# Altium footprint library Tomra_Cadstar_Footprints.PcbLib: 380 footprints (part 22 of 24)
Each footprint in its own frame and in the unit in brackets; x right, y up, seen from the top. Pads: shape width x height; smd on the part's side, far side on the other; paste and mask are expansions set on the pad; w line width, h text height; cw(c..) or ccw(c..) is an arc to the next point about the centre after c.
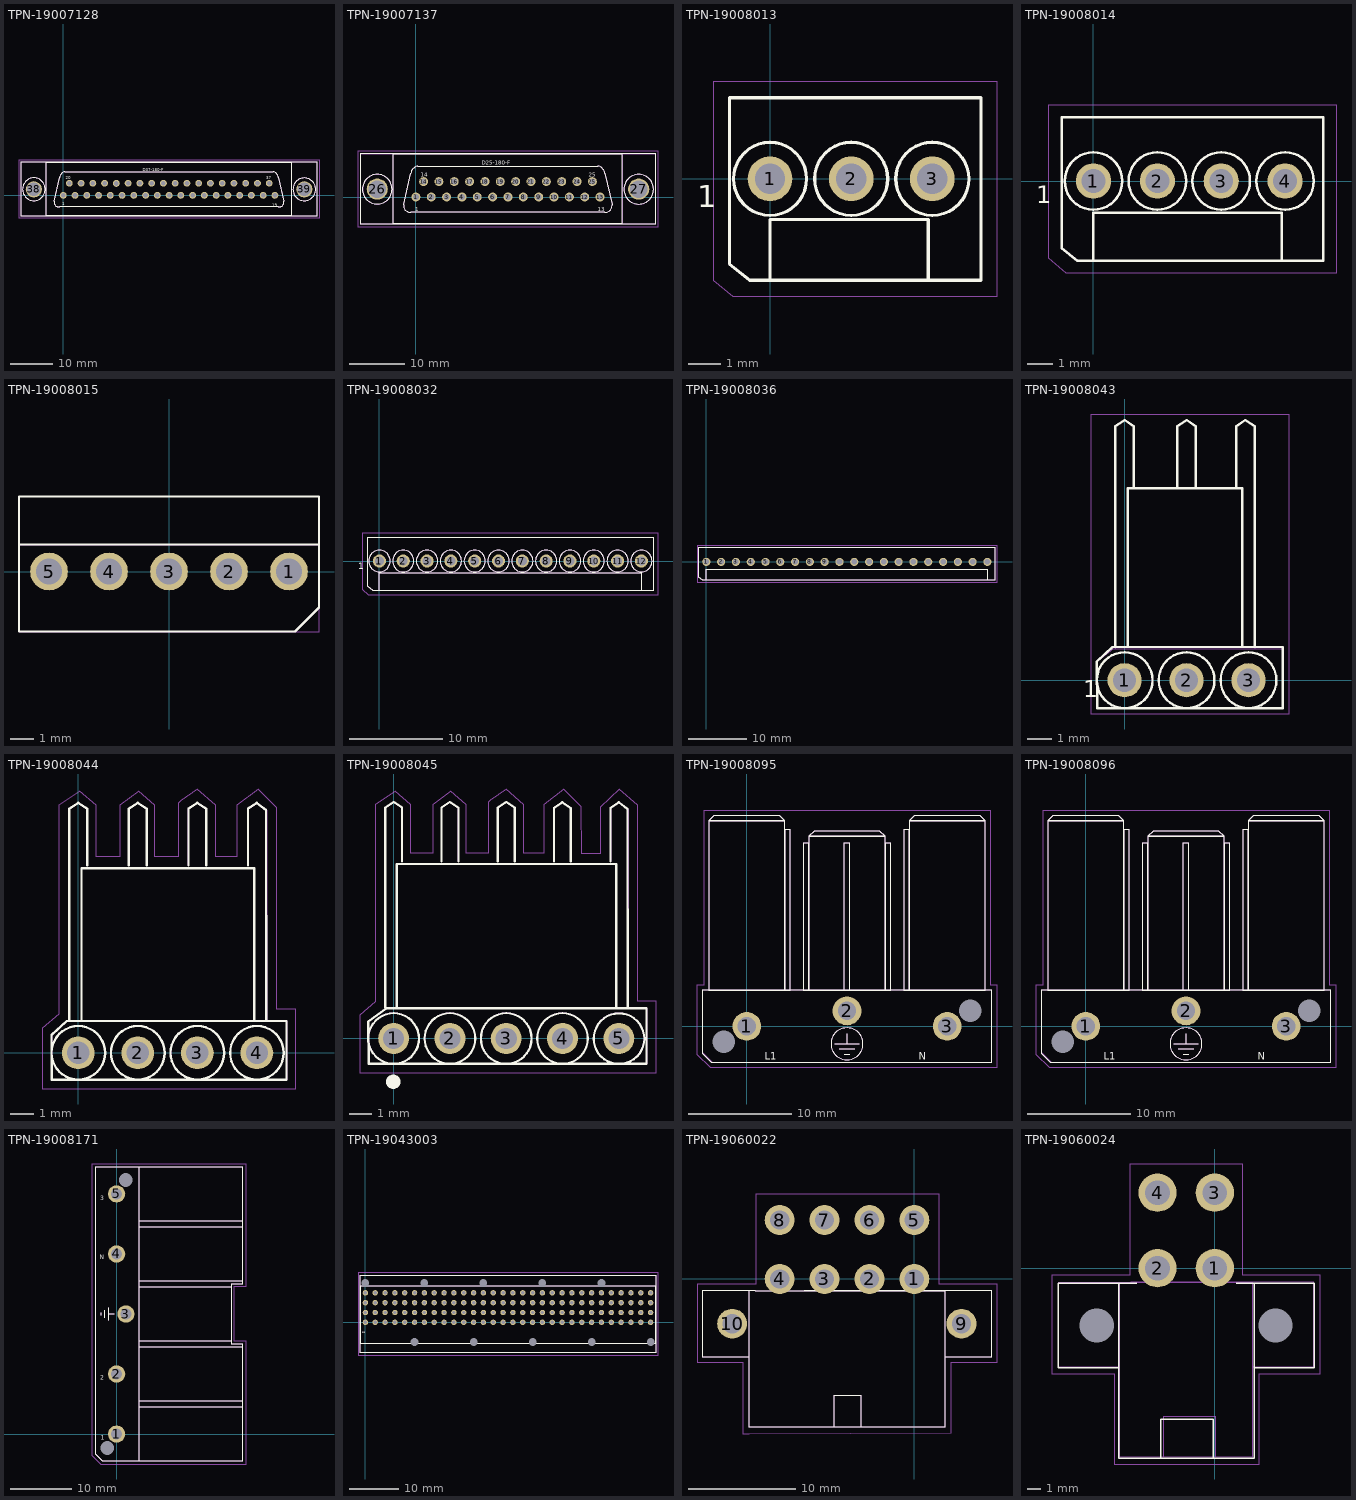
[diagram p21: the footprints below, top view; thin cyan lines are the x and y axes]

## TPN-19007128 [mm]
pads (39):
  round 1.6 / inner round 1.524 / far side round 1.6 hole 1.1 paste+0 mask+0: 1(0,0) 2(2.76,0) 3(5.52,0) 4(8.28,0) 5(11.04,0) 6(13.8,0) 7(16.56,0) 8(19.32,0) 9(22.08,0) 10(24.84,0) 11(27.6,0) 12(30.36,0) 13(33.12,0) 14(35.88,0) 15(38.64,0) 16(41.4,0) 17(44.16,0) 18(46.92,0) 19(49.68,0) 20(1.42,2.84) 21(4.18,2.84) 22(6.94,2.84) 23(9.7,2.84) 24(12.46,2.8) 25(15.22,2.84) 26(17.98,2.84) 27(20.74,2.84) 28(23.5,2.84) 29(26.26,2.84) 30(29.02,2.84) 31(31.78,2.84) 32(34.54,2.84) 33(37.3,2.84) 34(40.06,2.84) 35(42.82,2.84) 36(45.58,2.84) 37(48.34,2.84)
  round 3.8 / inner round 1.524 / far side round 3.8 hole 3.15 paste+0 mask+0: 38(-6.91,1.42) 39(56.58,1.41)
Top Silk:
  lines w0.1: -9.894,-4.861 59.527,-4.861 59.527,7.839 -9.894,7.839 -9.894,-4.861 ; -6.91,-1.247 cw(c-6.91,1.42) -6.91,4.087 cw(c-6.91,1.42) -6.91,-1.247 ; -4.052,-4.848 53.558,-4.848 53.558,7.801 -4.052,7.801 -4.052,-4.848 ; -2.147,-1.435 ccw(c-1.042,-1.6) -0.877,-2.705 50.51,-2.705 ccw(c50.675,-1.6) 51.78,-1.435 50.51,4.28 ccw(c48.923,3.962) 49.24,5.55 0.393,5.55 ccw(c0.626,4.047) -0.877,4.28 -2.147,-1.435 ; 56.58,-1.257 ccw(c56.58,1.41) 56.58,4.077 ccw(c56.58,1.41) 56.58,-1.257
  text "37" at 47.67,3.77 h0.7
  text "19" at 49.06,-2.65 h0.7
  text "20" at 0.62,3.77 h0.7
  text "1" at -0.22,-2.36 h0.7
  text "D37-180-F" at 18.66,5.7 h0.7
  text ".Designator" at 0,0 h0.7
Top Assembly:
  lines w0.05: -9.894,-4.861 59.527,-4.861 59.527,7.839 -9.894,7.839 -9.894,-4.861 ; -6.91,-1.247 cw(c-6.91,1.42) -6.91,4.087 cw(c-6.91,1.42) -6.91,-1.247 ; -4.052,-4.848 53.558,-4.848 53.558,7.801 -4.052,7.801 -4.052,-4.848 ; -2.147,-1.435 ccw(c-1.042,-1.6) -0.877,-2.705 50.51,-2.705 ccw(c50.675,-1.6) 51.78,-1.435 50.51,4.28 ccw(c48.923,3.962) 49.24,5.55 0.393,5.55 ccw(c0.626,4.047) -0.877,4.28 -2.147,-1.435 ; 56.58,-1.257 ccw(c56.58,1.41) 56.58,4.077 ccw(c56.58,1.41) 56.58,-1.257
  text "37" at 47.61,3.77 h0.7
  text "19" at 49,-2.65 h0.7
  text "20" at 0.56,3.77 h0.7
  text "1" at -0.28,-2.36 h0.7
  text "D37-180-F" at 18.66,5.7 h0.7
Top Placement:
  lines w0.01: -10.394,-5.361 60.027,-5.361 60.027,8.339 -10.394,8.339 -10.394,-5.361

## TPN-19007137 [mm]
height 17.5
pads (27):
  round 1.6 / inner round 1.524 / far side round 1.6 hole 1.1 paste+0 mask+0: 1(0,0) 2(2.76,0) 3(5.52,0) 4(8.28,0) 5(11.04,0) 6(13.8,0) 7(16.56,0) 8(19.32,0) 9(22.08,0) 10(24.84,0) 11(27.6,0) 12(30.36,0) 13(33.12,0) 14(1.38,2.78) 15(4.14,2.78) 16(6.9,2.78) 17(9.66,2.78) 18(12.42,2.78) 19(15.18,2.78) 20(17.94,2.78) 21(20.7,2.78) 22(23.46,2.78) 23(26.22,2.78) 24(28.98,2.78) 25(31.74,2.78)
  round 3.8 / inner round 1.524 / far side round 3.8 hole 3.15 paste+0 mask+0: 26(-6.958,1.42) 27(40.07,1.41)
Top Silk:
  lines w0.1: -9.942,-4.861 43.017,-4.861 43.017,7.839 -9.942,7.839 -9.942,-4.861 ; -6.958,-1.244 cw(c-6.958,1.423) -6.958,4.09 cw(c-6.958,1.423) -6.958,-1.244 ; -4.1,-4.848 37.048,-4.848 37.048,7.801 -4.1,7.801 -4.1,-4.848 ; -2.195,-1.435 ccw(c-1.09,-1.6) -0.925,-2.705 34,-2.705 ccw(c34.165,-1.6) 35.27,-1.435 34,4.28 ccw(c32.413,3.962) 32.73,5.55 0.345,5.55 ccw(c0.578,4.047) -0.925,4.28 -2.195,-1.435 ; 40.07,-1.257 ccw(c40.07,1.41) 40.07,4.077 ccw(c40.07,1.41) 40.07,-1.257
  text "1" at -0.16,-2.58 h0.7
  text "14" at 0.856,3.643 h0.7
  text "13" at 32.733,-2.58 h0.7
  text "25" at 31.082,3.643 h0.7
  text "D25-180-F" at 11.8,5.8 h0.7
  text ".Designator" at 0,0 h0.7
Top Assembly:
  lines w0.05: -9.916,-4.909 43.043,-4.909 43.043,7.791 -9.916,7.791 -9.916,-4.909 ; -6.932,-1.292 cw(c-6.932,1.375) -6.932,4.042 cw(c-6.932,1.375) -6.932,-1.292 ; -4.074,-4.896 37.074,-4.896 37.074,7.753 -4.074,7.753 -4.074,-4.896 ; -2.195,-1.435 ccw(c-1.09,-1.6) -0.925,-2.705 34,-2.705 ccw(c34.165,-1.6) 35.27,-1.435 34,4.28 ccw(c32.413,3.962) 32.73,5.55 0.345,5.55 ccw(c0.578,4.047) -0.925,4.28 -2.195,-1.435 ; 40.096,-1.305 ccw(c40.096,1.362) 40.096,4.029 ccw(c40.096,1.362) 40.096,-1.305
  text "1" at -0.163,-2.578 h0.7
  text "14" at 0.853,3.645 h0.7
  text "13" at 32.73,-2.578 h0.7
  text "25" at 31.079,3.645 h0.7
  text "D25-180-F" at 11.8,5.8 h0.7
Top Placement:
  lines w0.01: -10.416,-5.409 43.543,-5.409 43.543,8.291 -10.416,8.291 -10.416,-5.409

## TPN-19008013 [mm]
height 10
pads (3):
  round 1.4 / inner round 1.524 / far side round 1.4 hole 0.95 paste+0 mask+0: 1(0,0) 2(2.54,0) 3(5.08,0)
Top Silk:
  lines w0.1: 0,-3.175 0,-1.27 4.953,-1.27 4.953,-3.175 ; -1.27,-2.667 -0.635,-3.175 6.604,-3.175 6.604,2.54 -1.27,2.54 -1.27,-2.667 ; 0,-1.143 ccw(c0,0) 0,1.143 ccw(c0,0) 0,-1.143 ; 2.54,-1.143 ccw(c2.54,0) 2.54,1.143 ccw(c2.54,0) 2.54,-1.143 ; 5.08,-1.143 ccw(c5.08,0) 5.08,1.143 ccw(c5.08,0) 5.08,-1.143
  text "1" at -2.286,-0.889 h0.7
  text ".Designator" at 0,0 h0.7
Top Assembly:
  lines w0.05: 0,-3.175 0,-1.27 4.953,-1.27 4.953,-3.175 ; -1.27,-2.667 -0.635,-3.175 6.604,-3.175 6.604,2.54 -1.27,2.54 -1.27,-2.667 ; 0,-1.143 ccw(c0,0) 0,1.143 ccw(c0,0) 0,-1.143 ; 2.54,-1.143 ccw(c2.54,0) 2.54,1.143 ccw(c2.54,0) 2.54,-1.143 ; 5.08,-1.143 ccw(c5.08,0) 5.08,1.143 ccw(c5.08,0) 5.08,-1.143
  text "1" at -2.286,-0.889 h0.7
Top Placement:
  lines w0.01: -1.77,-3.175 -1.17,-3.675 7.104,-3.675 7.104,3.04 -1.77,3.04 -1.77,-3.175

## TPN-19008014 [mm]
pads (4):
  round 1.4 / inner round 1.524 / far side round 1.4 hole 0.95 paste+0 mask+0: 1(0,0) 2(2.54,0) 3(5.08,0) 4(7.62,0)
Top Silk:
  lines w0.1: 0,-3.175 0,-1.27 7.493,-1.27 7.493,-3.175 ; -1.27,-2.667 -0.635,-3.175 9.144,-3.175 9.144,2.54 -1.27,2.54 -1.27,-2.667 ; 0,-1.143 ccw(c0,0) 0,1.143 ccw(c0,0) 0,-1.143 ; 2.54,-1.143 ccw(c2.54,0) 2.54,1.143 ccw(c2.54,0) 2.54,-1.143 ; 5.08,-1.143 ccw(c5.08,0) 5.08,1.143 ccw(c5.08,0) 5.08,-1.143 ; 7.62,-1.143 ccw(c7.62,0) 7.62,1.143 ccw(c7.62,0) 7.62,-1.143
  text "1" at -2.286,-0.889 h0.7
  text ".Designator" at 0,0 h0.7
Top Assembly:
  lines w0.05: 0,-3.175 0,-1.27 7.493,-1.27 7.493,-3.175 ; -1.27,-2.667 -0.635,-3.175 9.144,-3.175 9.144,2.54 -1.27,2.54 -1.27,-2.667 ; 0,-1.143 ccw(c0,0) 0,1.143 ccw(c0,0) 0,-1.143 ; 2.54,-1.143 ccw(c2.54,0) 2.54,1.143 ccw(c2.54,0) 2.54,-1.143 ; 5.08,-1.143 ccw(c5.08,0) 5.08,1.143 ccw(c5.08,0) 5.08,-1.143 ; 7.62,-1.143 ccw(c7.62,0) 7.62,1.143 ccw(c7.62,0) 7.62,-1.143
  text "1" at -2.286,-0.889 h0.7
Top Placement:
  lines w0.01: -1.77,-3.078 -1.074,-3.675 9.644,-3.675 9.644,3.04 -1.77,3.04 -1.77,-3.078
  text "AMP-4" at 1.524,-3.175 h0.7

## TPN-19008015 [mm]
height 13.9
pads (5):
  round 1.6 / inner round 1.524 / far side round 1.6 hole 1.1 paste+0 mask+0: 1(5.08,0) 2(2.54,0) 3(0,0) 4(-2.54,0) 5(-5.08,0)
Top Silk:
  lines w0.1: -6.35,1.143 6.35,1.143 ; -6.35,-2.54 5.334,-2.54 6.35,-1.524 6.35,3.175 -6.35,3.175 -6.35,-2.54
  text ".Designator" at -5.715,3.81 h0.7
Top Assembly:
  lines w0.05: -6.35,1.143 6.35,1.143 ; -6.35,-2.54 5.334,-2.54 6.35,-1.524 6.35,3.175 -6.35,3.175 -6.35,-2.54
Top Placement:
  lines w0.01: -6.35,-2.54 6.35,-2.54 6.35,3.175 -6.35,3.175 -6.35,-2.54

## TPN-19008032 [mm]
pads (12):
  round 1.4 / inner round 1.524 / far side round 1.4 hole 0.95 paste+0 mask+0: 1(0,0) 2(2.54,0) 3(5.08,0) 4(7.62,0) 5(10.16,0) 6(12.7,0) 7(15.24,0) 8(17.78,0) 9(20.32,0) 10(22.86,0) 11(25.4,0) 12(27.94,0)
Top Silk:
  lines w0.1: 0,-3.175 0,-1.27 27.94,-1.27 27.94,-3.175 ; -1.27,-2.667 -0.635,-3.175 29.21,-3.175 29.21,2.54 -1.27,2.54 -1.27,-2.667 ; 0,-1.143 ccw(c0,0) 0,1.143 ccw(c0,0) 0,-1.143 ; 2.54,-1.143 ccw(c2.54,0) 2.54,1.143 ccw(c2.54,0) 2.54,-1.143 ; 5.08,-1.143 ccw(c5.08,0) 5.08,1.143 ccw(c5.08,0) 5.08,-1.143 ; 7.62,-1.143 ccw(c7.62,0) 7.62,1.143 ccw(c7.62,0) 7.62,-1.143 ; 10.16,-1.143 ccw(c10.16,0) 10.16,1.143 ccw(c10.16,0) 10.16,-1.143 ; 12.7,-1.143 ccw(c12.7,0) 12.7,1.143 ccw(c12.7,0) 12.7,-1.143 ; 15.24,-1.143 ccw(c15.24,0) 15.24,1.143 ccw(c15.24,0) 15.24,-1.143 ; 17.78,-1.143 ccw(c17.78,0) 17.78,1.143 ccw(c17.78,0) 17.78,-1.143 ; 20.32,-1.143 ccw(c20.32,0) 20.32,1.143 ccw(c20.32,0) 20.32,-1.143 ; 22.86,-1.143 ccw(c22.86,0) 22.86,1.143 ccw(c22.86,0) 22.86,-1.143 ; 25.4,-1.143 ccw(c25.4,0) 25.4,1.143 ccw(c25.4,0) 25.4,-1.143 ; 27.94,-1.143 ccw(c27.94,0) 27.94,1.143 ccw(c27.94,0) 27.94,-1.143
  text "1" at -2.286,-0.889 h0.7
  text ".Designator" at 0,0 h0.7
Top Assembly:
  lines w0.05: 0,-3.175 0,-1.27 27.94,-1.27 27.94,-3.175 ; -1.27,-2.667 -0.635,-3.175 29.21,-3.175 29.21,2.54 -1.27,2.54 -1.27,-2.667 ; 0,-1.143 ccw(c0,0) 0,1.143 ccw(c0,0) 0,-1.143 ; 2.54,-1.143 ccw(c2.54,0) 2.54,1.143 ccw(c2.54,0) 2.54,-1.143 ; 5.08,-1.143 ccw(c5.08,0) 5.08,1.143 ccw(c5.08,0) 5.08,-1.143 ; 7.62,-1.143 ccw(c7.62,0) 7.62,1.143 ccw(c7.62,0) 7.62,-1.143 ; 10.16,-1.143 ccw(c10.16,0) 10.16,1.143 ccw(c10.16,0) 10.16,-1.143 ; 12.7,-1.143 ccw(c12.7,0) 12.7,1.143 ccw(c12.7,0) 12.7,-1.143 ; 15.24,-1.143 ccw(c15.24,0) 15.24,1.143 ccw(c15.24,0) 15.24,-1.143 ; 17.78,-1.143 ccw(c17.78,0) 17.78,1.143 ccw(c17.78,0) 17.78,-1.143 ; 20.32,-1.143 ccw(c20.32,0) 20.32,1.143 ccw(c20.32,0) 20.32,-1.143 ; 22.86,-1.143 ccw(c22.86,0) 22.86,1.143 ccw(c22.86,0) 22.86,-1.143 ; 25.4,-1.143 ccw(c25.4,0) 25.4,1.143 ccw(c25.4,0) 25.4,-1.143 ; 27.94,-1.143 ccw(c27.94,0) 27.94,1.143 ccw(c27.94,0) 27.94,-1.143
  text "1" at -2.286,-0.889 h0.7
Top Placement:
  lines w0.01: -1.77,-3.078 -1.114,-3.675 29.71,-3.675 29.71,3.04 -1.77,3.04 -1.77,-3.078
  text "AMP MTA-100-12" at 7.62,-3.175 h0.7

## TPN-19008036 [mm]
height 7.9
pads (20):
  round 1.4 / inner round 1.524 / far side round 1.4 hole 0.95 paste+0 mask+0: 1(0,0) 2(2.54,0) 3(5.08,0) 4(7.62,0) 5(10.16,0) 6(12.7,0) 7(15.24,0) 8(17.78,0) 9(20.32,0) 10(22.86,0) 11(25.4,0) 12(27.94,0) 13(30.48,0) 14(33.02,0) 15(35.56,0) 16(38.1,0) 17(40.64,0) 18(43.18,0) 19(45.72,0) 20(48.26,0)
Top Silk:
  lines w0.1: 0,-3.175 0,-1.27 48.26,-1.27 48.26,-3.175 ; -1.27,-2.667 -0.635,-3.175 49.53,-3.175 49.53,2.54 -1.27,2.54 -1.27,-2.667
  text ".Designator" at -1.27,2.54 h0.7
Top Assembly:
  lines w0.05: 0,-3.175 0,-1.27 48.26,-1.27 48.26,-3.175 ; -1.27,-2.667 -0.635,-3.175 49.53,-3.175 49.53,2.54 -1.27,2.54 -1.27,-2.667
Top Placement:
  lines w0.01: -1.6,-3.5 49.9,-3.5 49.9,2.8 -1.6,2.8 -1.6,-3.5

## TPN-19008043 [mm]
height 5.7
pads (3):
  round 1.4 / inner round 1.524 / far side round 1.4 hole 0.95 paste+0 mask+0: 1(0,0) 2(2.54,0) 3(5.08,0)
Top Silk:
  lines w0.1: -0.381,1.397 -0.381,10.414 0,10.668 0.381,10.414 0.381,7.874 ; 0.127,1.36 0.127,7.874 4.826,7.874 4.826,1.36 ; 2.159,7.914 2.159,10.414 2.54,10.668 2.921,10.414 2.921,7.914 ; 4.572,7.914 4.572,10.414 4.953,10.668 5.334,10.414 5.334,1.397 ; -1.143,0.762 -1.13,-1.143 6.477,-1.143 6.477,1.36 -0.495,1.36 -1.143,0.762 ; 0,-1.143 ccw(c0,0) 0,1.143 ccw(c0,0) 0,-1.143 ; 2.54,-1.143 ccw(c2.54,0) 2.54,1.143 ccw(c2.54,0) 2.54,-1.143 ; 5.08,-1.143 ccw(c5.08,0) 5.08,1.143 ccw(c5.08,0) 5.08,-1.143
  text "1" at -1.7,-0.7 h0.7
  text ".Designator" at -1.2,-2.4 h0.7
Top Assembly:
  lines w0.05: -0.381,1.314 -0.381,10.414 0,10.668 0.381,10.414 0.381,7.874 ; 0.127,1.36 0.127,7.874 4.826,7.874 4.826,1.36 ; 2.159,7.914 2.159,10.414 2.54,10.668 2.921,10.414 2.921,7.914 ; 4.572,7.914 4.572,10.414 4.953,10.668 5.334,10.414 5.334,1.314 ; 0,-1.143 ccw(c0,0) 0,1.143 ; 0,-1.143 cw(c0,0) 0,1.143 ; 0,-1.143 ccw(c0,0) 0,1.143 ; 0,-1.143 cw(c0,0) 0,1.143 ; 2.54,-1.143 ccw(c2.54,0) 2.54,1.143 ; 2.54,-1.143 cw(c2.54,0) 2.54,1.143 ; 2.54,-1.143 ccw(c2.54,0) 2.54,1.143 ; 2.54,-1.143 cw(c2.54,0) 2.54,1.143 ; 5.08,-1.143 ccw(c5.08,0) 5.08,1.143 ; 5.08,-1.143 cw(c5.08,0) 5.08,1.143 ; 5.08,-1.143 ccw(c5.08,0) 5.08,1.143 ; 5.08,-1.143 cw(c5.08,0) 5.08,1.143 ; -1.143,0.762 -0.495,1.27 6.477,1.27 6.477,-1.143 -1.13,-1.143 -1.143,0.762
  text "1" at -1.7,-0.7 h0.7
Top Placement:
  lines w0.01: -1.366,-1.386 -1.366,10.914 6.734,10.914 6.734,-1.386 -1.366,-1.386

## TPN-19008044 [mm]
pads (4):
  round 1.4 / inner round 1.524 / far side round 1.4 hole 0.95 paste+0 mask+0: 1(0,0) 2(2.54,0) 3(5.08,0) 4(7.62,0)
Top Silk:
  lines w0.1: 0.14,1.36 0.14,7.874 7.51,7.874 7.51,1.36 ; 7.239,8.001 7.239,10.414 7.62,10.668 8.01,10.36 8.019,1.431 ; -0.381,10.414 0,10.668 ; -0.381,10.414 -0.381,1.397 -0.381,10.414 ; -0.381,10.414 0,10.668 ; 0,-1.143 ccw(c0,0) 0,1.143 ; 0,-1.143 cw(c0,0) 0,1.143 ; 0,-1.143 ccw(c0,0) 0,1.143 ; 0,-1.143 cw(c0,0) 0,1.143 ; 0,10.668 0.381,10.414 ; 0,10.668 0.381,10.414 ; 0.381,10.414 0.381,8.001 0.381,10.414 ; 2.159,10.414 2.54,10.668 ; 2.159,10.414 2.159,8.001 2.159,10.414 ; 2.159,10.414 2.54,10.668 ; 2.54,-1.143 ccw(c2.54,0) 2.54,1.143 ; 2.54,-1.143 cw(c2.54,0) 2.54,1.143 ; 2.54,-1.143 ccw(c2.54,0) 2.54,1.143 ; 2.54,-1.143 cw(c2.54,0) 2.54,1.143 ; 2.54,10.668 2.921,10.414 ; 2.54,10.668 2.921,10.414 ; 2.921,10.414 2.921,8.001 2.921,10.414 ; 4.699,10.414 4.699,8.001 4.699,10.414 ; 4.699,10.414 5.08,10.668 ; 4.699,10.414 5.08,10.668 ; 5.08,-1.143 ccw(c5.08,0) 5.08,1.143 ; 5.08,-1.143 cw(c5.08,0) 5.08,1.143 ; 5.08,-1.143 ccw(c5.08,0) 5.08,1.143 ; 5.08,-1.143 cw(c5.08,0) 5.08,1.143 ; 5.08,10.668 5.461,10.414 ; 5.08,10.668 5.461,10.414 ; 5.461,10.414 5.461,8.001 5.461,10.414 ; 7.62,-1.143 ccw(c7.62,0) 7.62,1.143 ; 7.62,-1.143 cw(c7.62,0) 7.62,1.143 ; 7.62,-1.143 ccw(c7.62,0) 7.62,1.143 ; 7.62,-1.143 cw(c7.62,0) 7.62,1.143 ; -1.143,0.762 -1.13,-1.143 8.885,-1.143 8.885,1.36 -0.495,1.36 -1.143,0.762
  text ".Designator" at 0,0 h0.7
Top Assembly:
  lines w0.05: 7.26,7.985 7.26,10.398 7.641,10.652 8.031,10.344 8.04,1.415 ; -1.143,0.762 -0.495,1.36 ; -1.143,0.762 -1.13,-1.143 ; -1.143,0.762 -1.13,-1.143 ; -1.143,0.762 -0.495,1.36 ; -1.13,-1.143 8.885,-1.143 ; -1.13,-1.143 8.885,-1.143 ; -0.495,1.36 8.885,1.36 ; -0.495,1.36 8.885,1.36 ; -0.381,10.414 0,10.668 ; -0.381,10.414 -0.381,1.397 -0.381,10.414 ; -0.381,10.414 0,10.668 ; 0,-1.143 ccw(c0,0) 0,1.143 ; 0,-1.143 cw(c0,0) 0,1.143 ; 0,-1.143 ccw(c0,0) 0,1.143 ; 0,-1.143 cw(c0,0) 0,1.143 ; 0,10.668 0.381,10.414 ; 0,10.668 0.381,10.414 ; 0.14,7.874 0.14,1.36 0.14,7.874 ; 0.14,7.874 7.51,7.874 ; 0.14,7.874 7.51,7.874 ; 0.381,10.414 0.381,8.001 0.381,10.414 ; 2.159,10.414 2.54,10.668 ; 2.159,10.414 2.159,8.001 2.159,10.414 ; 2.159,10.414 2.54,10.668 ; 2.54,-1.143 ccw(c2.54,0) 2.54,1.143 ; 2.54,-1.143 cw(c2.54,0) 2.54,1.143 ; 2.54,-1.143 ccw(c2.54,0) 2.54,1.143 ; 2.54,-1.143 cw(c2.54,0) 2.54,1.143 ; 2.54,10.668 2.921,10.414 ; 2.54,10.668 2.921,10.414 ; 2.921,10.414 2.921,8.001 2.921,10.414 ; 4.699,10.414 4.699,8.001 4.699,10.414 ; 4.699,10.414 5.08,10.668 ; 4.699,10.414 5.08,10.668 ; 5.08,-1.143 ccw(c5.08,0) 5.08,1.143 ; 5.08,-1.143 cw(c5.08,0) 5.08,1.143 ; 5.08,-1.143 ccw(c5.08,0) 5.08,1.143 ; 5.08,-1.143 cw(c5.08,0) 5.08,1.143 ; 5.08,10.668 5.461,10.414 ; 5.08,10.668 5.461,10.414 ; 5.461,10.414 5.461,8.001 5.461,10.414 ; 7.51,7.874 7.51,1.36 7.51,7.874 ; 7.62,-1.143 ccw(c7.62,0) 7.62,1.143 ; 7.62,-1.143 cw(c7.62,0) 7.62,1.143 ; 7.62,-1.143 ccw(c7.62,0) 7.62,1.143 ; 7.62,-1.143 cw(c7.62,0) 7.62,1.143 ; 8.885,-1.143 8.885,1.36 ; 8.885,-1.143 8.885,1.36
  text "1" at -2.286,-0.889 h0.7
  text "1" at -2.286,-0.889 h0.7
  text "1" at -2.286,-0.889 h0.7
Top Placement:
  lines w0.01: -1.53,-1.543 9.27,-1.543 9.27,1.857 8.47,1.857 8.47,10.457 7.67,11.257 6.77,10.557 6.77,8.357 5.87,8.357 5.87,10.557 5.07,11.257 4.37,10.757 4.27,10.657 4.27,8.357 3.27,8.357 3.27,10.557 2.57,11.157 1.77,10.557 1.77,8.357 0.77,8.357 0.77,10.557 0.07,11.157 -0.83,10.557 -0.83,1.657 -1.53,1.057 -1.53,-1.543
  text "AMP" at 2.51,5.61 h0.7
  text "4" at 5.26,3.485 h0.7
  text "MTA" at 1.26,3.485 h0.7

## TPN-19008045 [mm]
pads (5):
  round 1.4 / inner round 1.524 / far side round 1.4 hole 0.95 paste+0 mask+0: 1(0,0) 2(2.54,0) 3(5.08,0) 4(7.62,0) 5(10.16,0)
Top Silk:
  region: -0.02,-2.28 -0.084,-2.28 -0.201,-2.231 -0.291,-2.141 -0.34,-2.024 -0.34,-1.896 -0.291,-1.779 -0.201,-1.689 -0.084,-1.64 -0.02,-1.64 0.044,-1.64 0.161,-1.689 0.251,-1.779 0.3,-1.896 0.3,-2.024 0.251,-2.141 0.161,-2.231 0.044,-2.28
  lines w0.1: 0.14,1.36 0.14,7.874 10.04,7.874 10.04,1.36 ; 4.699,8.001 4.699,10.414 5.08,10.668 5.461,10.414 5.461,8.001 ; 7.23,7.99 7.23,10.403 7.611,10.657 7.992,10.403 7.992,7.99 ; 9.78,7.99 9.78,10.403 10.161,10.657 10.551,10.349 10.56,1.42 ; -0.381,10.414 0,10.668 ; -0.381,10.414 -0.381,1.397 -0.381,10.414 ; -0.381,10.414 0,10.668 ; 0,-1.143 ccw(c0,0) 0,1.143 ; 0,-1.143 cw(c0,0) 0,1.143 ; 0,-1.143 ccw(c0,0) 0,1.143 ; 0,-1.143 cw(c0,0) 0,1.143 ; 0,10.668 0.381,10.414 ; 0,10.668 0.381,10.414 ; 0.381,10.414 0.381,8.001 0.381,10.414 ; 2.159,10.414 2.54,10.668 ; 2.159,10.414 2.159,8.001 2.159,10.414 ; 2.159,10.414 2.54,10.668 ; 2.54,-1.143 ccw(c2.54,0) 2.54,1.143 ; 2.54,-1.143 cw(c2.54,0) 2.54,1.143 ; 2.54,-1.143 ccw(c2.54,0) 2.54,1.143 ; 2.54,-1.143 cw(c2.54,0) 2.54,1.143 ; 2.54,10.668 2.921,10.414 ; 2.54,10.668 2.921,10.414 ; 2.921,10.414 2.921,8.001 2.921,10.414 ; 5.08,-1.143 ccw(c5.08,0) 5.08,1.143 ; 5.08,-1.143 cw(c5.08,0) 5.08,1.143 ; 5.08,-1.143 ccw(c5.08,0) 5.08,1.143 ; 5.08,-1.143 cw(c5.08,0) 5.08,1.143 ; 7.62,-1.143 ccw(c7.62,0) 7.62,1.143 ; 7.62,-1.143 cw(c7.62,0) 7.62,1.143 ; 7.62,-1.143 ccw(c7.62,0) 7.62,1.143 ; 7.62,-1.143 cw(c7.62,0) 7.62,1.143 ; -1.143,0.762 -1.127,-1.143 11.41,-1.143 11.41,1.36 -0.332,1.36 -1.143,0.762 ; 10.17,-1.153 ccw(c10.17,-0.01) 10.17,1.133 ccw(c10.17,-0.01) 10.17,-1.153
  text ".Designator" at 0,0 h0.7
Top Assembly:
  lines w0.05: 0.14,1.36 0.14,7.874 10.01,7.874 10.01,1.36 ; 7.23,7.99 7.23,10.403 7.611,10.657 7.992,10.403 7.992,7.99 ; 9.81,7.99 9.81,10.403 10.191,10.657 10.581,10.349 10.59,1.42 ; -1.143,0.762 -0.332,1.36 ; -1.143,0.762 -1.127,-1.143 ; -1.143,0.762 -1.127,-1.143 ; -1.143,0.762 -0.332,1.36 ; -1.127,-1.143 11.41,-1.143 ; -1.127,-1.143 11.41,-1.143 ; -0.381,10.414 0,10.668 ; -0.381,10.414 -0.381,1.397 -0.381,10.414 ; -0.381,10.414 0,10.668 ; -0.332,1.36 11.41,1.36 ; -0.332,1.36 11.41,1.36 ; 0,-1.143 ccw(c0,0) 0,1.143 ; 0,-1.143 cw(c0,0) 0,1.143 ; 0,-1.143 ccw(c0,0) 0,1.143 ; 0,-1.143 cw(c0,0) 0,1.143 ; 0,10.668 0.381,10.414 ; 0,10.668 0.381,10.414 ; 0.381,10.414 0.381,8.001 0.381,10.414 ; 2.159,10.414 2.54,10.668 ; 2.159,10.414 2.159,8.001 2.159,10.414 ; 2.159,10.414 2.54,10.668 ; 2.54,-1.143 ccw(c2.54,0) 2.54,1.143 ; 2.54,-1.143 cw(c2.54,0) 2.54,1.143 ; 2.54,-1.143 ccw(c2.54,0) 2.54,1.143 ; 2.54,-1.143 cw(c2.54,0) 2.54,1.143 ; 2.54,10.668 2.921,10.414 ; 2.54,10.668 2.921,10.414 ; 2.921,10.414 2.921,8.001 2.921,10.414 ; 4.699,10.414 4.699,8.001 4.699,10.414 ; 4.699,10.414 5.08,10.668 ; 4.699,10.414 5.08,10.668 ; 5.08,-1.143 ccw(c5.08,0) 5.08,1.143 ; 5.08,-1.143 cw(c5.08,0) 5.08,1.143 ; 5.08,-1.143 ccw(c5.08,0) 5.08,1.143 ; 5.08,-1.143 cw(c5.08,0) 5.08,1.143 ; 5.08,10.668 5.461,10.414 ; 5.08,10.668 5.461,10.414 ; 5.461,10.414 5.461,8.001 5.461,10.414 ; 7.62,-1.143 ccw(c7.62,0) 7.62,1.143 ; 7.62,-1.143 cw(c7.62,0) 7.62,1.143 ; 7.62,-1.143 ccw(c7.62,0) 7.62,1.143 ; 7.62,-1.143 cw(c7.62,0) 7.62,1.143 ; 11.41,-1.143 11.41,1.36 ; 11.41,-1.143 11.41,1.36 ; 10.16,-1.143 ccw(c10.16,0) 10.16,1.143 ccw(c10.16,0) 10.16,-1.143
  text "1" at -2.286,-0.889 h0.7
  text "1" at -2.286,-0.889 h0.7
  text "1" at -2.286,-0.889 h0.7
Top Placement:
  lines w0.01: -1.53,-1.543 11.85,-1.55 11.85,1.68 11.02,1.68 11.02,10.53 10.17,11.24 9.32,10.44 9.32,8.33 8.48,8.33 8.47,10.457 7.67,11.257 6.77,10.557 6.77,8.357 5.87,8.357 5.87,10.557 5.07,11.257 4.37,10.757 4.27,10.657 4.27,8.357 3.27,8.357 3.27,10.557 2.57,11.157 1.77,10.557 1.77,8.357 0.77,8.357 0.77,10.557 0.07,11.157 -0.83,10.557 -0.83,1.657 -1.53,1.057 -1.53,-1.543
  text "AMP" at 3.57,5.69 h0.7
  text "5" at 6.58,3.57 h0.7
  text "MTA" at 2.32,3.61 h0.7

## TPN-19008095 [mm]
height 13
pads (5):
  round 2.8 / inner round 1.524 / far side round 2.8 hole 1.8 paste+0 mask+0: 1(0,0) 2(9.75,1.5) 3(19.5,0)
  round 0 / inner round 1.524 / far side round 0 hole 2.2 unplated paste+0 mask+0: 4(-2.25,-1.5) 5(21.75,1.5)
Top Silk:
  lines w0.1: 8.55,-1.7 10.95,-1.7 ; 9,-2.2 10.5,-2.2 ; 9.5,-2.7 10,-2.7 ; 9.75,-1.7 9.75,-0.7 ; -3.7,20 3.7,20 ; -3.7,20 -3.7,3.5 3.7,3.5 ; -3.7,20 -3.2,20.5 3.2,20.5 3.7,20 ; -3.7,20 3.7,20 ; 3.7,3.5 3.7,20 ; 3.7,3.5 3.7,19.15 4.25,19.15 4.25,3.5 3.7,3.5 ; 6.05,3.5 6.05,18.5 ; 6.05,3.5 13.45,3.5 ; 6.05,3.5 6.05,17.8 5.5,17.8 5.5,3.5 6.05,3.5 ; 6.05,18.5 13.45,18.5 ; 6.05,18.5 6.55,19 12.95,19 13.45,18.5 ; 6.05,18.5 13.45,18.5 ; 13.45,3.5 13.45,18.5 ; 13.45,3.5 13.45,17.8 14,17.8 14,3.5 13.45,3.5 ; 15.8,3.5 15.8,19.15 15.25,19.15 15.25,3.5 15.8,3.5 ; 15.8,3.5 15.8,20 ; 15.8,3.5 23.2,3.5 23.2,20 ; 15.8,20 16.3,20.5 22.7,20.5 23.2,20 ; 15.8,20 23.2,20 ; 15.8,20 23.2,20 ; -4.35,-2.6 -4.35,3.5 23.85,3.5 23.85,-3.5 -3.45,-3.5 -4.35,-2.6 ; 9.45,3.5 9.45,17.8 10,17.8 10,3.5 9.45,3.5 ; 9.75,-3.25 cw(c9.75,-1.7) 9.75,-0.15 cw(c9.75,-1.7) 9.75,-3.25
  text "L1" at 1.75,-3.25 h0.7
  text "N" at 16.75,-3.25 h0.7
  text ".Designator" at 0,0 h0.7
Top Assembly:
  lines w0.05: 8.55,-1.7 10.95,-1.7 ; 9,-2.2 10.5,-2.2 ; 9.5,-2.7 10,-2.7 ; 9.75,-1.7 9.75,-0.7 ; -3.7,20 3.7,20 ; -3.7,20 -3.7,3.5 3.7,3.5 ; -3.7,20 -3.2,20.5 3.2,20.5 3.7,20 ; -3.7,20 3.7,20 ; 3.7,3.5 3.7,19.15 4.25,19.15 4.25,3.5 3.7,3.5 ; 3.7,3.5 3.7,20 ; 6.05,3.5 6.05,18.5 ; 6.05,3.5 13.45,3.5 ; 6.05,3.5 6.05,17.8 5.5,17.8 5.5,3.5 6.05,3.5 ; 6.05,18.5 13.45,18.5 ; 6.05,18.5 6.55,19 12.95,19 13.45,18.5 ; 6.05,18.5 13.45,18.5 ; 13.45,3.5 13.45,18.5 ; 13.45,3.5 13.45,17.8 14,17.8 14,3.5 13.45,3.5 ; 15.8,3.5 15.8,19.15 15.25,19.15 15.25,3.5 15.8,3.5 ; 15.8,3.5 15.8,20 ; 15.8,3.5 23.2,3.5 23.2,20 ; 15.8,20 16.3,20.5 22.7,20.5 23.2,20 ; 15.8,20 23.2,20 ; 15.8,20 23.2,20 ; -4.35,-2.5 -4.35,3.5 23.85,3.5 23.85,-3.5 -3.35,-3.5 -4.35,-2.5 ; 9.45,3.5 9.45,17.8 10,17.8 10,3.5 9.45,3.5 ; 9.75,-3.25 cw(c9.75,-1.7) 9.75,-0.15 cw(c9.75,-1.7) 9.75,-3.25
  text "L1" at 1.75,-3.25 h0.7
  text "N" at 16.75,-3.25 h0.7
Top Placement:
  lines w0.01: -4.85,-2.7 -3.55,-4 24.35,-4 24.35,4 23.75,4 23.75,21 -4.2,21 -4.2,4 -4.85,4 -4.85,-2.7

## TPN-19008096 [mm]
height 13
pads (5):
  round 2.8 / inner round 1.524 / far side round 2.8 hole 1.8 paste+0 mask+0: 1(0,0) 2(9.75,1.5) 3(19.5,0)
  round 0 / inner round 1.524 / far side round 0 hole 2.2 unplated paste+0 mask+0: 4(-2.25,-1.5) 5(21.75,1.5)
Top Silk:
  lines w0.1: 8.55,-1.7 10.95,-1.7 ; 9,-2.2 10.5,-2.2 ; 9.5,-2.7 10,-2.7 ; 9.75,-1.7 9.75,-0.7 ; -3.7,20 3.7,20 ; -3.7,20 -3.7,3.5 3.7,3.5 ; -3.7,20 -3.2,20.5 3.2,20.5 3.7,20 ; -3.7,20 3.7,20 ; 3.7,3.5 3.7,20 ; 3.7,3.5 3.7,19.15 4.25,19.15 4.25,3.5 3.7,3.5 ; 6.05,3.5 6.05,18.5 ; 6.05,3.5 13.45,3.5 ; 6.05,3.5 6.05,17.8 5.5,17.8 5.5,3.5 6.05,3.5 ; 6.05,18.5 13.45,18.5 ; 6.05,18.5 6.55,19 12.95,19 13.45,18.5 ; 6.05,18.5 13.45,18.5 ; 13.45,3.5 13.45,18.5 ; 13.45,3.5 13.45,17.8 14,17.8 14,3.5 13.45,3.5 ; 15.8,3.5 15.8,19.15 15.25,19.15 15.25,3.5 15.8,3.5 ; 15.8,3.5 15.8,20 ; 15.8,3.5 23.2,3.5 23.2,20 ; 15.8,20 16.3,20.5 22.7,20.5 23.2,20 ; 15.8,20 23.2,20 ; 15.8,20 23.2,20 ; -4.35,-2.6 -4.35,3.5 23.85,3.5 23.85,-3.5 -3.45,-3.5 -4.35,-2.6 ; 9.45,3.5 9.45,17.8 10,17.8 10,3.5 9.45,3.5 ; 9.75,-3.25 cw(c9.75,-1.7) 9.75,-0.15 cw(c9.75,-1.7) 9.75,-3.25
  text "L1" at 1.75,-3.25 h0.7
  text "N" at 16.75,-3.25 h0.7
  text ".Designator" at 0,0 h0.7
Top Assembly:
  lines w0.05: 8.55,-1.7 10.95,-1.7 ; 9,-2.2 10.5,-2.2 ; 9.5,-2.7 10,-2.7 ; 9.75,-1.7 9.75,-0.7 ; -3.7,20 3.7,20 ; -3.7,20 -3.7,3.5 3.7,3.5 ; -3.7,20 -3.2,20.5 3.2,20.5 3.7,20 ; -3.7,20 3.7,20 ; 3.7,3.5 3.7,19.15 4.25,19.15 4.25,3.5 3.7,3.5 ; 3.7,3.5 3.7,20 ; 6.05,3.5 6.05,18.5 ; 6.05,3.5 13.45,3.5 ; 6.05,3.5 6.05,17.8 5.5,17.8 5.5,3.5 6.05,3.5 ; 6.05,18.5 13.45,18.5 ; 6.05,18.5 6.55,19 12.95,19 13.45,18.5 ; 6.05,18.5 13.45,18.5 ; 13.45,3.5 13.45,18.5 ; 13.45,3.5 13.45,17.8 14,17.8 14,3.5 13.45,3.5 ; 15.8,3.5 15.8,19.15 15.25,19.15 15.25,3.5 15.8,3.5 ; 15.8,3.5 15.8,20 ; 15.8,3.5 23.2,3.5 23.2,20 ; 15.8,20 16.3,20.5 22.7,20.5 23.2,20 ; 15.8,20 23.2,20 ; 15.8,20 23.2,20 ; -4.35,-2.5 -4.35,3.5 23.85,3.5 23.85,-3.5 -3.35,-3.5 -4.35,-2.5 ; 9.45,3.5 9.45,17.8 10,17.8 10,3.5 9.45,3.5 ; 9.75,-3.25 cw(c9.75,-1.7) 9.75,-0.15 cw(c9.75,-1.7) 9.75,-3.25
  text "L1" at 1.75,-3.25 h0.7
  text "N" at 16.75,-3.25 h0.7
Top Placement:
  lines w0.01: -4.85,-2.7 -3.55,-4 24.35,-4 24.35,4 23.75,4 23.75,21 -4.2,21 -4.2,4 -4.85,4 -4.85,-2.7

## TPN-19008171 [mm]
height 13
pads (7):
  round 2.8 / inner round 1.524 / far side round 2.8 hole 1.8 paste+0 mask+0: 1(0,0) 2(0,9.75) 3(1.5,19.5) 4(0,29.25) 5(0,39)
  round 0 / inner round 1.524 / far side round 0 hole 2.2 unplated paste+0 mask+0: 6(1.5,41.25) 7(-1.5,-2.25)
Top Silk:
  lines w0.1: -2.6,19.3 -2.6,19.7 ; -2,18.9 -2,20.1 ; -1.4,18.5 -1.4,20.5 ; -1.4,19.5 -0.4,19.5 ; 3.55,-4.35 20.5,-4.35 ; 3.55,-4.35 3.55,4.35 20.5,4.35 20.5,-4.35 ; 3.55,-4.35 3.55,43.35 ; 3.55,43.35 20.5,43.35 ; 3.55,43.35 3.55,34.65 20.5,34.65 20.5,43.35 ; 20.5,-4.35 -2.35,-4.35 -3.5,-3.2 -3.5,43.35 20.5,43.35 ; 20.5,-4.35 20.5,14.55 18.65,14.55 18.65,24.45 20.5,24.45 20.5,43.35 ; 3.55,5.4 20.5,5.4 20.5,14.1 3.55,14.1 3.55,5.4 ; 3.55,15.15 18.65,15.15 18.65,23.85 3.55,23.85 3.55,15.15 ; 3.55,24.9 20.5,24.9 20.5,33.6 3.55,33.6 3.55,24.9
  text "3" at -2.7,38 h0.7
  text "N" at -2.75,28.4 h0.7
  text "2" at -2.7,8.8 h0.7
  text "1" at -2.6,-0.95 h0.7
  text ".Designator" at 0,0 h0.7
Top Assembly:
  lines w0.05: -2.6,19.3 -2.6,19.7 ; -2,18.9 -2,20.1 ; -1.4,18.5 -1.4,20.5 ; -1.4,19.5 -0.4,19.5 ; 3.55,-4.35 20.5,-4.35 ; 3.55,-4.35 3.55,4.35 20.5,4.35 20.5,-4.35 ; 3.55,-4.35 3.55,43.35 ; 3.55,43.35 20.5,43.35 ; 3.55,43.35 3.55,34.65 20.5,34.65 20.5,43.35 ; 20.5,-4.35 -2.35,-4.35 -3.5,-3.2 -3.5,43.35 20.5,43.35 ; 20.5,-4.35 20.5,14.55 18.65,14.55 18.65,24.45 20.5,24.45 20.5,43.35 ; 3.55,5.4 20.5,5.4 20.5,14.1 3.55,14.1 3.55,5.4 ; 3.55,15.15 18.65,15.15 18.65,23.85 3.55,23.85 3.55,15.15 ; 3.55,24.9 20.5,24.9 20.5,33.6 3.55,33.6 3.55,24.9
  text "N" at -2.75,28.4 h0.7
  text "3" at -2.7,38 h0.7
  text "2" at -2.7,8.8 h0.7
  text "1" at -2.6,-0.95 h0.7
Top Placement:
  lines w0.01: -4,-3.4 -2.55,-4.85 21,-4.85 21,15.1 19.073,15.1 19.073,24 21,24 21,43.85 -4,43.85 -4,-3.4

## TPN-19043003 [mm]
pads (130):
  round 0 / inner round 1.524 / far side round 0 hole 1.55 unplated paste+0 mask+0: 121(0,8) 122(12,8) 123(24,8) 124(36,8) 125(48,8) 126(10,-4) 127(22,-4) 128(34,-4) 129(46,-4) 130(58,-4)
  round 1.1 / inner round 1.524 / far side round 1.1 hole 0.7 paste+0 mask+0: A1(0,0) A2(2,0) A3(4,0) A4(6,0) A5(8,0) A6(10,0) A7(12,0) A8(14,0) A9(16,0) A10(18,0) A11(20,0) A12(22,0) A13(24,0) A14(26,0) A15(28,0) A16(30,0) A17(32,0) A18(34,0) A19(36,0) A20(38,0) A21(40,0) A22(42,0) A23(44,0) A24(46,0) A25(48,0) A26(50,0) A27(52,0) A28(54,0) A29(56,0) A30(58,0) B1(0,2) B2(2,2) B3(4,2) B4(6,2) B5(8,2) B6(10,2) B7(12,2) B8(14,2) B9(16,2) B10(18,2) B11(20,2) B12(22,2) B13(24,2) B14(26,2) B15(28,2) B16(30,2) B17(32,2) B18(34,2) B19(36,2) B20(38,2) B21(40,2) B22(42,2) B23(44,2) B24(46,2) B25(48,2) B26(50,2) B27(52,2) B28(54,2) B29(56,2) B30(58,2) C1(0,4) C2(2,4) C3(4,4) C4(6,4) C5(8,4) C6(10,4) C7(12,4) C8(14,4) C9(16,4) C10(18,4) C11(20,4) C12(22,4) C13(24,4) C14(26,4) C15(28,4) C16(30,4) C17(32,4) C18(34,4) C19(36,4) C20(38,4) C21(40,4) C22(42,4) C23(44,4) C24(46,4) C25(48,4) C26(50,4) C27(52,4) C28(54,4) C29(56,4) C30(58,4) D1(0,6) D2(2,6) D3(4,6) D4(6,6) D5(8,6) D6(10,6) D7(12,6) D8(14,6) D9(16,6) D10(18,6) D11(20,6) D12(22,6) D13(24,6) D14(26,6) D15(28,6) D16(30,6) D17(32,6) D18(34,6) D19(36,6) D20(38,6) D21(40,6) D22(42,6) D23(44,6) D24(46,6) D25(48,6) D26(50,6) D27(52,6) D28(54,6) D29(56,6) D30(58,6)
Top Silk:
  lines w0.1: -1,-6.2 59,-6.2 59,9.6 -1,9.6 -1,-6.2 ; -1,-4.2 59,-4.2 59,7.3 -1,7.3 -1,-4.2
  text "A1" at -0.6,-2.2 h0.35
  text ".Designator" at 0,0 h0.7
Top Assembly:
  lines w0.05: -1,-6.2 59,-6.2 59,9.6 -1,9.6 -1,-6.2 ; -1,-4.2 59,-4.2 59,7.3 -1,7.3 -1,-4.2
Top Placement:
  lines w0.01: -1.5,-6.7 59.5,-6.7 59.5,10.1 -1.5,10.1 -1.5,-6.7

## TPN-19060022 [mm]
pads (10):
  round 2.8 / inner round 1.524 / far side round 2.8 hole 1.8 paste+0 mask+0: 1(0,0) 2(-4.191,0) 3(-8.407,0) 4(-12.598,0) 5(0,5.512) 6(-4.191,5.512) 7(-8.407,5.512) 8(-12.598,5.512) 9(4.42,-4.191) 10(-17.043,-4.191)
Top Silk:
  lines w0.1: -15.443,-7.29 -19.837,-7.29 -19.837,-1.092 -14.884,-1.092 2.845,-1.092 2.845,-13.894 -15.443,-13.894 -15.443,-1.092 ; -10.312,-1.092 7.239,-1.092 7.239,-7.29 2.87,-7.29 ; -7.518,-13.843 -7.518,-10.922 -4.978,-10.922 -4.978,-13.843
  text ".Designator" at 0,0 h0.7
Top Assembly:
  lines w0.05: -15.443,-7.29 -19.837,-7.29 -19.837,-1.092 -14.884,-1.092 2.845,-1.092 2.845,-13.894 -15.443,-13.894 -15.443,-1.092 ; -10.312,-1.092 7.239,-1.092 7.239,-7.29 2.87,-7.29 ; -7.518,-13.843 -7.518,-10.922 -4.978,-10.922 -4.978,-13.843
Top Placement:
  lines w0.01: -20.337,-7.794 -20.337,-0.494 -14.843,-0.494 -14.843,7.906 2.357,7.906 2.357,-0.494 7.739,-0.494 7.739,-7.794 3.457,-7.794 3.457,-14.39 -15.465,-14.47 -16.043,-14.469 -16.043,-7.794 -20.337,-7.794

## TPN-19060024 [mm]
height 10
pads (6):
  round 2.8 / inner round 1.524 / far side round 2.8 hole 1.8 paste+0 mask+0: 1(0,0) 2(-4.191,0) 3(0,5.512) 4(-4.191,5.512)
  round 0 / inner round 1.524 / far side round 0 hole 2.5 unplated paste+0 mask+0: 5(4.445,-4.191) 6(-8.636,-4.191)
Top Silk:
  lines w0.1: -7.036,-7.29 -11.43,-7.29 -11.43,-1.092 -5.715,-1.092 ; -7.036,-1.092 -7.036,-13.894 2.87,-13.894 2.87,-1.092 1.549,-1.092 ; -3.937,-13.843 -3.937,-11.049 -0.127,-11.049 -0.127,-13.843 ; 2.87,-7.29 7.264,-7.29 7.264,-1.092 2.896,-1.092
  text ".Designator" at 0,0 h0.7
Top Assembly:
  lines w0.05: -7.036,-7.214 -11.43,-7.214 -11.43,-1.016 2.743,-1.016 2.743,-13.818 -6.96,-13.818 -6.96,-1.016 ; -6.147,-1.016 7.214,-1.016 7.214,-7.214 2.819,-7.214 ; -3.759,-13.767 -3.759,-10.846 0.051,-10.846 0.051,-13.767
Top Placement:
  lines w0.01: -11.93,-7.714 -11.93,-0.516 -6.215,-0.516 -6.215,7.612 2.024,7.612 2.024,-0.516 7.714,-0.516 7.714,-7.714 3.243,-7.714 3.243,-14.318 -7.366,-14.318 -7.366,-7.714 -11.93,-7.714